# Altium footprint library Footprints.PcbLib: 158 footprints (part 10 of 10)
Each footprint in its own frame and in the unit in brackets; x right, y up, seen from the top. Pads: shape width x height; smd on the part's side, far side on the other; paste and mask are expansions set on the pad; w line width, h text height; cw(c..) or ccw(c..) is an arc to the next point about the centre after c.
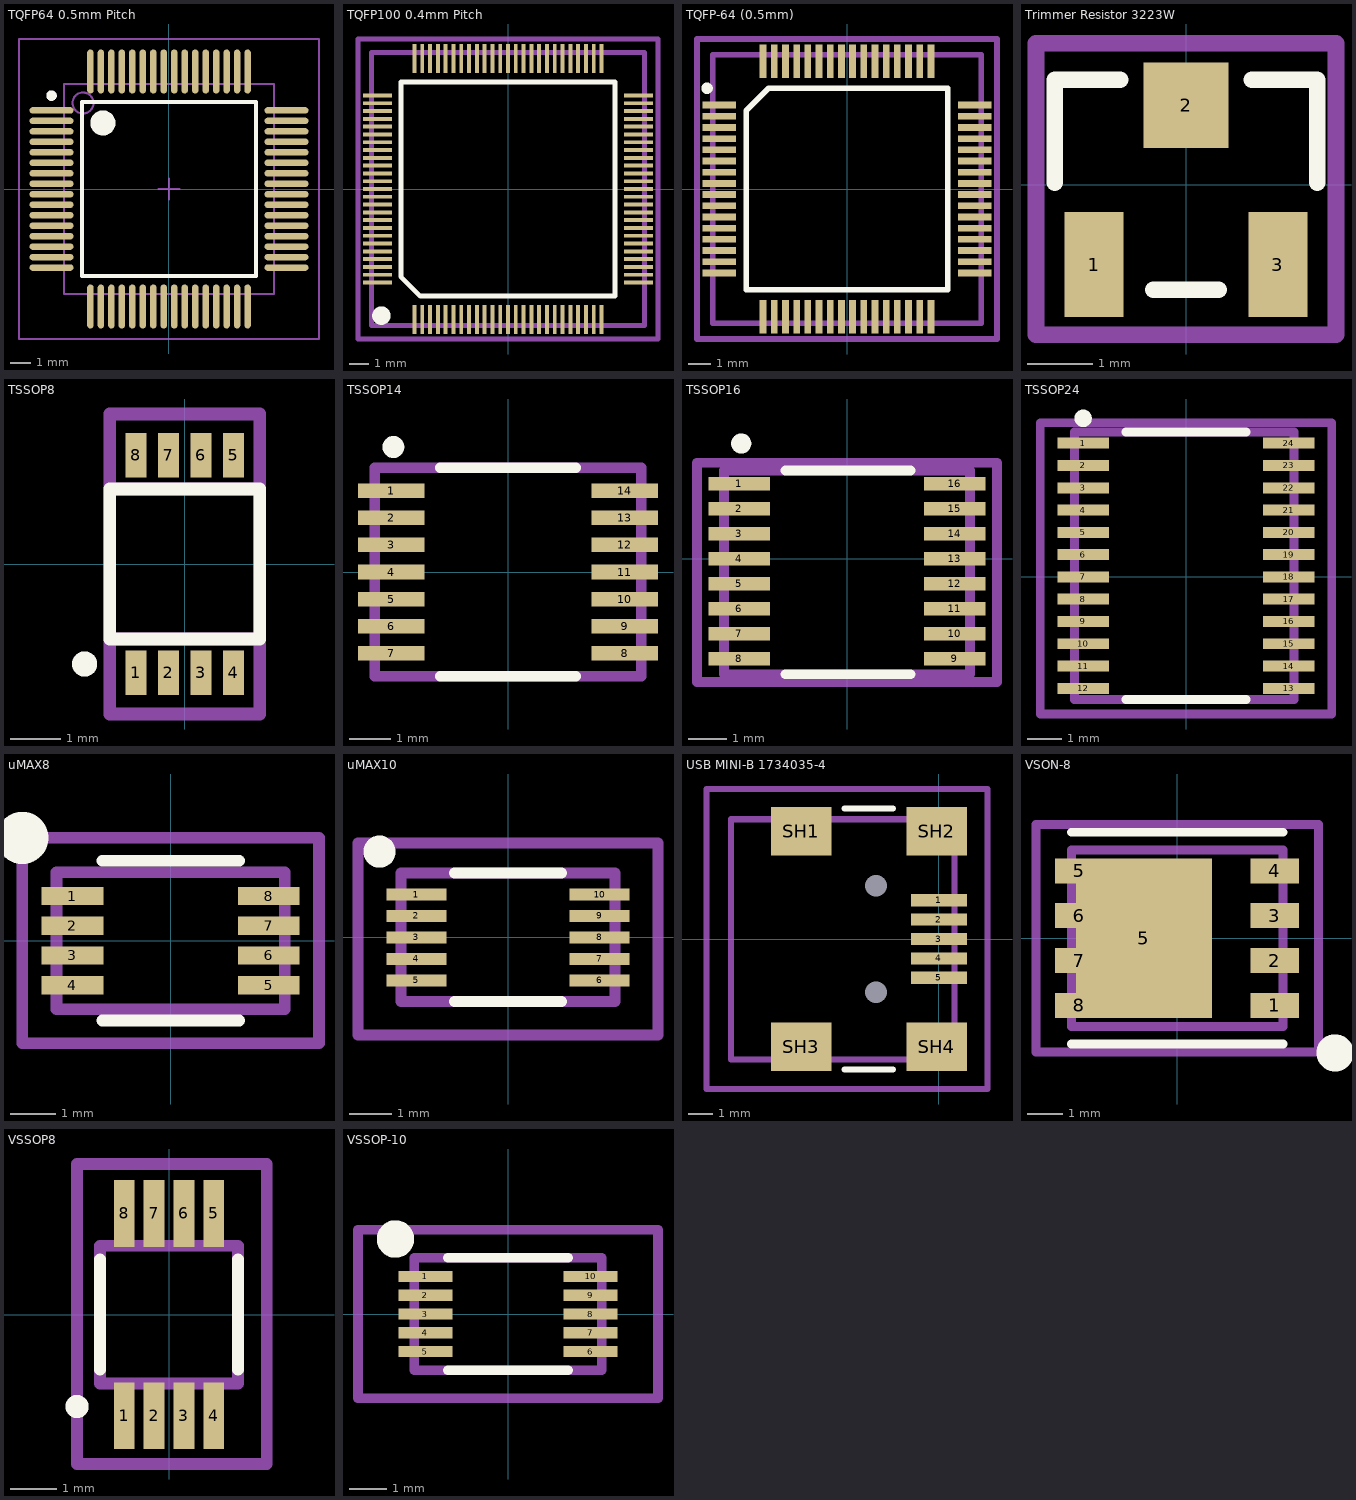
[diagram p9: the footprints below, top view; thin cyan lines are the x and y axes]

## TQFP64 0.5mm Pitch [mm] "64-Pin Thin Quad Flat Pack 0.5 mm Pitch, IPC Low Density"
height 1.6
pads (64):
  oval 2.1x0.3 smd: 1(-5.6,3.75) 2(-5.6,3.25) 3(-5.6,2.75) 4(-5.6,2.25) 5(-5.6,1.75) 6(-5.6,1.25) 7(-5.6,0.75) 8(-5.6,0.25) 9(-5.6,-0.25) 10(-5.6,-0.75) 11(-5.6,-1.25) 12(-5.6,-1.75) 13(-5.6,-2.25) 14(-5.6,-2.75) 15(-5.6,-3.25) 16(-5.6,-3.75) 33(5.6,-3.75) 34(5.6,-3.25) 35(5.6,-2.75) 36(5.6,-2.25) 37(5.6,-1.75) 38(5.6,-1.25) 39(5.6,-0.75) 40(5.6,-0.25) 41(5.6,0.25) 42(5.6,0.75) 43(5.6,1.25) 44(5.6,1.75) 45(5.6,2.25) 46(5.6,2.75) 47(5.6,3.25) 48(5.6,3.75)
  oval 0.3x2.1 smd: 17(-3.75,-5.6) 18(-3.25,-5.6) 19(-2.75,-5.6) 20(-2.25,-5.6) 21(-1.75,-5.6) 22(-1.25,-5.6) 23(-0.75,-5.6) 24(-0.25,-5.6) 25(0.25,-5.6) 26(0.75,-5.6) 27(1.25,-5.6) 28(1.75,-5.6) 29(2.25,-5.6) 30(2.75,-5.6) 31(3.25,-5.6) 32(3.75,-5.6) 49(3.75,5.6) 50(3.25,5.6) 51(2.75,5.6) 52(2.25,5.6) 53(1.75,5.6) 54(1.25,5.6) 55(0.75,5.6) 56(0.25,5.6) 57(-0.25,5.6) 58(-0.75,5.6) 59(-1.25,5.6) 60(-1.75,5.6) 61(-2.25,5.6) 62(-2.75,5.6) 63(-3.25,5.6) 64(-3.75,5.6)
Top Overlay:
  circle w0.6: c-3.15,3.15 r0.3
  circle w0.25: c-5.6,4.45 r0.125
  lines w0.2: -4.15,-4.15 4.15,-4.15 4.15,4.15 -4.15,4.15 -4.15,-4.15
Mechanical 13:
  circle w0.1: c-4.1,4.1 r0.5
  lines w0.1: -5,-5 5,-5 5,5 -5,5 -5,-5
Mechanical 15:
  lines w0.1: -0.5,0 0.5,0 ; 0,-0.5 0,0.5 ; -7.15,-7.15 7.15,-7.15 7.15,7.15 -7.15,7.15 -7.15,-7.15
3D body: height 1.6, standoff 0, extent -5,-5 5,5

## TQFP100 0.4mm Pitch [mm] "TQFP100 0.4mm pitch"
height 1
pads (100):
  rect 0.2x1.5 smd mask+0.102: 1(-4.8,-6.7) 2(-4.4,-6.7) 3(-4,-6.7) 4(-3.6,-6.7) 5(-3.2,-6.7) 6(-2.8,-6.7) 7(-2.4,-6.7) 8(-2,-6.7) 9(-1.6,-6.7) 10(-1.2,-6.7) 11(-0.8,-6.7) 12(-0.4,-6.7) 13(0,-6.7) 14(0.4,-6.7) 15(0.8,-6.7) 16(1.2,-6.7) 17(1.6,-6.7) 18(2,-6.7) 19(2.4,-6.7) 20(2.8,-6.7) 21(3.2,-6.7) 22(3.6,-6.7) 23(4,-6.7) 24(4.4,-6.7) 25(4.8,-6.7) 51(4.8,6.7) 52(4.4,6.7) 53(4,6.7) 54(3.6,6.7) 55(3.2,6.7) 56(2.8,6.7) 57(2.4,6.7) 58(2,6.7) 59(1.6,6.7) 60(1.2,6.7) 61(0.8,6.7) 62(0.4,6.7) 63(0,6.7) 64(-0.4,6.7) 65(-0.8,6.7) 66(-1.2,6.7) 67(-1.6,6.7) 68(-2,6.7) 69(-2.4,6.7) 70(-2.8,6.7) 71(-3.2,6.7) 72(-3.6,6.7) 73(-4,6.7) 74(-4.4,6.7) 75(-4.8,6.7)
  rect 1.5x0.2 smd mask+0.102: 26(6.7,-4.8) 27(6.7,-4.4) 28(6.7,-4) 29(6.7,-3.6) 30(6.7,-3.2) 31(6.7,-2.8) 32(6.7,-2.4) 33(6.7,-2) 34(6.7,-1.6) 35(6.7,-1.2) 36(6.7,-0.8) 37(6.7,-0.4) 38(6.7,0) 39(6.7,0.4) 40(6.7,0.8) 41(6.7,1.2) 42(6.7,1.6) 43(6.7,2) 44(6.7,2.4) 45(6.7,2.8) 46(6.7,3.2) 47(6.7,3.6) 48(6.7,4) 49(6.7,4.4) 50(6.7,4.8) 76(-6.7,4.8) 77(-6.7,4.4) 78(-6.7,4) 79(-6.7,3.6) 80(-6.7,3.2) 81(-6.7,2.8) 82(-6.7,2.4) 83(-6.7,2) 84(-6.7,1.6) 85(-6.7,1.2) 86(-6.7,0.8) 87(-6.7,0.4) 88(-6.7,0) 89(-6.7,-0.4) 90(-6.7,-0.8) 91(-6.7,-1.2) 92(-6.7,-1.6) 93(-6.7,-2) 94(-6.7,-2.4) 95(-6.7,-2.8) 96(-6.7,-3.2) 97(-6.7,-3.6) 98(-6.7,-4) 99(-6.7,-4.4) 100(-6.7,-4.8)
Top Overlay:
  circle w0.5: c-6.5,-6.5 r0.224
  lines w0.254: -5.5,-4.5 -4.5,-5.5 5.5,-5.5 5.5,5.5 -5.5,5.5 -5.5,-4.5
Mechanical 13:
  lines w0.254: -7,-7 -7,7 7,7 7,-7 -7,-7
Mechanical 15:
  lines w0.254: -7.7,-7.7 -7.7,7.7 7.7,7.7 7.7,-7.7 -7.7,-7.7
3D body: height 1, standoff 0, extent -6.9,-7 7.1,7

## TQFP-64 (0.5mm) [mm] "0.5mm Pitch"
height 1.2
pads (64):
  rect 1.5x0.3 smd mask+0.102: 1(-5.7,3.75) 2(-5.7,3.25) 3(-5.7,2.75) 4(-5.7,2.25) 5(-5.7,1.75) 6(-5.7,1.25) 7(-5.7,0.75) 8(-5.7,0.25) 9(-5.7,-0.25) 10(-5.7,-0.75) 11(-5.7,-1.25) 12(-5.7,-1.75) 13(-5.7,-2.25) 14(-5.7,-2.75) 15(-5.7,-3.25) 16(-5.7,-3.75) 33(5.7,-3.75) 34(5.7,-3.25) 35(5.7,-2.75) 36(5.7,-2.25) 37(5.7,-1.75) 38(5.7,-1.25) 39(5.7,-0.75) 40(5.7,-0.25) 41(5.7,0.25) 42(5.7,0.75) 43(5.7,1.25) 44(5.7,1.75) 45(5.7,2.25) 46(5.7,2.75) 47(5.7,3.25) 48(5.7,3.75)
  rect 0.3x1.5 smd mask+0.102: 17(-3.75,-5.7) 18(-3.25,-5.7) 19(-2.75,-5.7) 20(-2.25,-5.7) 21(-1.75,-5.7) 22(-1.25,-5.7) 23(-0.75,-5.7) 24(-0.25,-5.7) 25(0.25,-5.7) 26(0.75,-5.7) 27(1.25,-5.7) 28(1.75,-5.7) 29(2.25,-5.7) 30(2.75,-5.7) 31(3.25,-5.7) 32(3.75,-5.7) 49(3.75,5.7) 50(3.25,5.7) 51(2.75,5.7) 52(2.25,5.7) 53(1.75,5.7) 54(1.25,5.7) 55(0.75,5.7) 56(0.25,5.7) 57(-0.25,5.7) 58(-0.75,5.7) 59(-1.25,5.7) 60(-1.75,5.7) 61(-2.25,5.7) 62(-2.75,5.7) 63(-3.25,5.7) 64(-3.75,5.7)
Top Overlay:
  circle w0.254: c-6.25,4.5 r0.127
  lines w0.254: -4.5,-4.5 -4.5,3.5 -3.5,4.5 4.5,4.5 4.5,-4.5 -4.5,-4.5
Mechanical 13:
  lines w0.254: -6,-6 6,-6 6,6 -6,6 -6,-6
Mechanical 15:
  lines w0.254: -6.7,-6.7 6.7,-6.7 6.7,6.7 -6.7,6.7 -6.7,-6.7
3D body: height 1.2, standoff 0, extent -6,-6 6,6

## Trimmer Resistor 3223W [mm] "SMD Trimmer Resistor"
height 3.9
pads (3):
  rect 0.9x1.6 smd mask+0.102: 1(-1.4,-1.215) 3(1.4,-1.215)
  rect 1.3x1.3 smd mask+0.102: 2(0,1.215)
Top Overlay:
  lines w0.254: -2,0.032 -2,1.6 -1,1.6 ; -0.5,-1.6 0.5,-1.6 ; 1,1.6 2,1.6 2,0.032
Mechanical 15:
  lines w0.254: -2.286,-2.286 2.286,-2.286 2.286,2.159 -2.286,2.159 -2.286,-2.286
3D body: height 4, standoff 0, extent -2,-1.6 2,1.6

## TSSOP8 [mm] "3.1x3.1mm"
height 1.1
pads (8):
  rect 0.42x0.889 smd mask+0.102: 1(-0.975,-2.171) 2(-0.325,-2.171) 3(0.325,-2.171) 4(0.975,-2.171) 5(0.975,2.171) 6(0.325,2.171) 7(-0.325,2.171) 8(-0.975,2.171)
Top Overlay:
  circle w0.254: c-2,-2 r0.125
  lines w0.254: -1.5,-1.5 -1.5,1.5 1.5,1.5 1.5,-1.5 -1.5,-1.5
Mechanical 13:
  lines w0.254: -1.5,-1.5 1.5,-1.5 1.5,1.5 -1.5,1.5 -1.5,-1.5
Mechanical 15:
  lines w0.254: -1.5,-3 1.5,-3 1.5,3 -1.5,3 -1.5,-3
3D body: height 1.1, standoff 0, extent -1.55,-2.475 1.55,2.525

## TSSOP14 [mm] "0.65mm Pitch"
height 1.75
pads (14):
  rect 1.6x0.35 smd mask+0.102: 1(-2.8,1.95) 2(-2.8,1.3) 3(-2.8,0.65) 4(-2.8,0) 5(-2.8,-0.65) 6(-2.8,-1.3) 7(-2.8,-1.95) 8(2.8,-1.95) 9(2.8,-1.3) 10(2.8,-0.65) 11(2.8,0) 12(2.8,0.65) 13(2.8,1.3) 14(2.8,1.95)
Top Overlay:
  circle w0.254: c-2.75,3 r0.135
  lines w0.254: -1.625,-2.5 1.625,-2.5 ; -1.625,2.5 1.625,2.5
Mechanical 13:
  lines w0.254: -3.2,-2.5 3.2,-2.5 3.2,2.5 -3.2,2.5 -3.2,-2.5
3D body: height 1.1, standoff 0, extent -3.2,-2.5 3.2,2.5

## TSSOP16 [mm] "0.65mm Pitch"
height 1.75
pads (16):
  rect 1.6x0.35 smd mask+0.102: 1(-2.8,1.95) 2(-2.8,1.3) 3(-2.8,0.65) 4(-2.8,0) 5(-2.8,-0.65) 6(-2.8,-1.3) 7(-2.8,-1.95) 8(-2.8,-2.6) 9(2.8,-2.6) 10(2.8,-1.95) 11(2.8,-1.3) 12(2.8,-0.65) 13(2.8,0) 14(2.8,0.65) 15(2.8,1.3) 16(2.8,1.95)
Top Overlay:
  circle w0.254: c-2.75,3 r0.135
  lines w0.254: -1.6,-3 1.65,-3 ; -1.6,2.3 1.65,2.3
Mechanical 13:
  lines w0.254: -3.2,-3 -3.2,2.3 3.2,2.3 3.2,-3 -3.2,-3
Mechanical 15:
  lines w0.254: -3.9,-3.2 -3.9,2.5 3.9,2.5 3.9,-3.2 -3.9,-3.2
3D body: height 1.09, standoff 0, extent -3.058,-2.825 3.222,2.175

## TSSOP24 [mm]
height 1.2
pads (24):
  rect 1.5x0.32 smd mask+0.102: 1(-3,3.9) 2(-3,3.25) 3(-3,2.6) 4(-3,1.95) 5(-3,1.3) 6(-3,0.65) 7(-3,0) 8(-3,-0.65) 9(-3,-1.3) 10(-3,-1.95) 11(-3,-2.6) 12(-3,-3.25) 13(3,-3.25) 14(3,-2.6) 15(3,-1.95) 16(3,-1.3) 17(3,-0.65) 18(3,0) 19(3,0.65) 20(3,1.3) 21(3,1.95) 22(3,2.6) 23(3,3.25) 24(3,3.9)
Top Overlay:
  circle w0.254: c-3.002,4.625 r0.127
  lines w0.254: -1.75,-3.575 1.75,-3.575 ; -1.75,4.225 1.75,4.225
Mechanical 13:
  lines w0.254: -3.25,-3.575 -3.25,4.225 3.15,4.225 3.15,-3.575 -3.25,-3.575
Mechanical 15:
  lines w0.254: -4.25,-4 4.25,-4 4.25,4.5 -4.25,4.5 -4.25,-4
3D body: height 1.21, standoff -0.01, extent -3.177,-3.595 3.225,4.204

## uMAX8 [mm]
height 1.1
pads (8):
  rect 1.35x0.4 smd: 1(-2.15,0.975) 2(-2.15,0.325) 3(-2.15,-0.325) 4(-2.15,-0.975) 5(2.15,-0.975) 6(2.15,-0.325) 7(2.15,0.325) 8(2.15,0.975)
Top Overlay:
  circle w1: c-3.25,2.25 r0.071
  lines w0.254: -1.5,-1.75 1.5,-1.75 ; -1.5,1.75 1.5,1.75
Mechanical 13:
  lines w0.254: -2.5,-1.5 2.5,-1.5 2.5,1.5 -2.5,1.5 -2.5,-1.5
Mechanical 15:
  lines w0.254: -3.25,-2.25 -3.25,2.25 3.25,2.25 3.25,-2.25 -3.25,-2.25
3D body: height 0.95, standoff 0, extent -2.5,-1.5 2.5,1.5

## uMAX10 [mm]
height 1.1
pads (10):
  rect 1.4x0.28 smd: 1(-2.14,1) 2(-2.14,0.5) 3(-2.14,0) 4(-2.14,-0.5) 5(-2.14,-1) 6(2.14,-1) 7(2.14,-0.5) 8(2.14,0) 9(2.14,0.5) 10(2.14,1)
Top Overlay:
  circle w0.5: c-3,2 r0.125
  lines w0.254: -1.25,-1.5 1.25,-1.5 ; -1.25,1.5 1.25,1.5
Mechanical 13:
  lines w0.254: -2.5,-1.5 -2.5,1.5 2.5,1.5 2.5,-1.5 -2.5,-1.5
Mechanical 15:
  lines w0.254: -3.5,-2.275 -3.5,2.2 3.5,2.2 3.5,-2.275 -3.5,-2.275
3D body: height 0.95, standoff 0, extent -2.5,-1.5 2.5,1.5

## USB MINI-B 1734035-4 [mm] "USB MINI B FEMALE"
height 3.1
pads (11):
  round 0.1 hole 0.9: 0(-2.6,-2.2) 0(-2.6,2.2)
  rect 2.3x0.5 smd: 1(0,1.6) 2(0,0.8) 3(0,0) 4(0,-0.8) 5(0,-1.6)
  rect 2.5x2 smd: SH1(-5.7,4.45) SH2(-0.1,4.45) SH3(-5.7,-4.45) SH4(-0.1,-4.45)
Top Overlay:
  lines w0.254: -3.9,-5.4 -1.9,-5.4 ; -3.9,5.4 -1.9,5.4
Mechanical 13:
  lines w0.254: -8.6,-4.975 0.65,-4.975 0.65,4.95 -8.6,4.95 -8.6,-4.975
Mechanical 15:
  lines w0.254: -9.6,-6.2 -9.6,6.2 2,6.2 2,-6.2 -9.6,-6.2
3D body: height 3.98, standoff -0.95, extent -8.5,-4.95 0.75,4.95

## VSON-8 [mm]
height 1
pads (9):
  rect 1.372x0.71 smd paste-10: 1(2.77,-1.905) 2(2.77,-0.635) 3(2.77,0.635) 4(2.77,1.905) 5(-2.77,1.905) 6(-2.77,0.635) 7(-2.77,-0.635) 8(-2.77,-1.905)
  rect 3.85x4.52 smd paste-20: 5(-0.94,0)
Top Overlay:
  circle w1: c4.475,-3.25 r0.025
  lines w0.254: -3,-3 3,-3 ; -3,3 3,3
Top Paste:
  rectangle: 2.349,1.651 3.113,2.159
  rectangle: 2.347,0.381 3.113,0.889
  rectangle: 2.347,-2.159 3.113,-1.651
  rectangle: 2.347,-0.889 3.113,-0.381
  rectangle: -3.153,-0.889 -2.387,-0.381
  rectangle: -3.153,-2.159 -2.387,-1.651
  rectangle: -3.153,0.381 -2.387,0.889
  rectangle: -3.151,1.651 -2.387,2.159
  rectangle: -0.55,0.175 0.75,0.925
  rectangle: -2.15,0.175 -0.85,0.925
  rectangle: -2.15,1.275 -0.85,2.025
  rectangle: -0.55,1.275 0.75,2.025
  rectangle: -0.55,-0.925 0.75,-0.175
  rectangle: -2.15,-0.925 -0.85,-0.175
  rectangle: -2.15,-2.025 -0.85,-1.275
  rectangle: -0.55,-2.025 0.75,-1.275
Mechanical 13:
  lines w0.254: -3,-2.5 -3,2.5 3,2.5 3,-2.5 -3,-2.5
Mechanical 15:
  lines w0.254: -4,-3.225 4,-3.225 4,3.225 -4,3.225 -4,-3.225
3D body: height 0.3, standoff 0, extent -3.025,-2.225 -2.975,-1.575
3D body: height 0.3, standoff 0, extent -3.025,-0.95 -2.975,-0.3
3D body: height 0.3, standoff 0, extent -3.025,0.3 -2.975,0.95
3D body: height 0.3, standoff 0, extent -3.025,1.575 -2.975,2.225
3D body: height 0.3, standoff 0, extent 2.975,1.575 3.025,2.225
3D body: height 0.3, standoff 0, extent 2.975,0.325 3.025,0.975
3D body: height 0.3, standoff 0, extent 2.975,-0.95 3.025,-0.3
3D body: height 0.3, standoff 0, extent 2.975,-2.225 3.025,-1.575
3D body: height 1, standoff 0, extent -3,-2.5 3,2.5
3D body: height 1, standoff 0, extent 2.075,-2.175 2.675,-1.575

## VSSOP8 [mm] "3.1x3.1mm"
height 1.1
pads (8):
  rect 0.45x1.45 smd mask+0.102: 1(-0.975,-2.2) 2(-0.325,-2.2) 3(0.325,-2.2) 4(0.975,-2.2) 5(0.975,2.2) 6(0.325,2.2) 7(-0.325,2.2) 8(-0.975,2.2)
Top Overlay:
  circle w0.254: c-2,-2 r0.125
  lines w0.254: -1.5,-1.2 -1.5,1.2 ; 1.5,-1.2 1.5,1.2
Mechanical 13:
  lines w0.254: -1.5,-1.5 1.5,-1.5 1.5,1.5 -1.5,1.5 -1.5,-1.5
Mechanical 15:
  lines w0.254: -2,-3.25 2.125,-3.25 2.125,3.275 -2,3.275 -2,-3.25
3D body: height 1.1, standoff 0, extent -1.55,-2.475 1.55,2.525

## VSSOP-10 [mm]
height 1.1
pads (10):
  rect 1.45x0.3 smd: 1(-2.2,1) 2(-2.2,0.5) 3(-2.2,0) 4(-2.2,-0.5) 5(-2.2,-1) 6(2.2,-1) 7(2.2,-0.5) 8(2.2,0) 9(2.2,0.5) 10(2.2,1)
Top Overlay:
  circle w0.5: c-3,2 r0.25
  lines w0.254: -1.6,-1.5 1.6,-1.5 ; -1.6,1.5 1.6,1.5
Mechanical 13:
  lines w0.254: -2.5,-1.5 2.5,-1.5 2.5,1.5 -2.5,1.5 -2.5,-1.5
Mechanical 15:
  lines w0.254: -4,-2.25 4,-2.25 4,2.25 -4,2.25 -4,-2.25
3D body: height 1.1, standoff 0, extent -2.5,-1.5 2.5,1.5